# Altium footprint library h_sensor_safety.PcbLib: 73 footprints (part 1 of 5)
Each footprint in its own frame and in the unit in brackets; x right, y up, seen from the top. Pads: shape width x height; smd on the part's side, far side on the other; paste and mask are expansions set on the pad; w line width, h text height; cw(c..) or ccw(c..) is an arc to the next point about the centre after c.
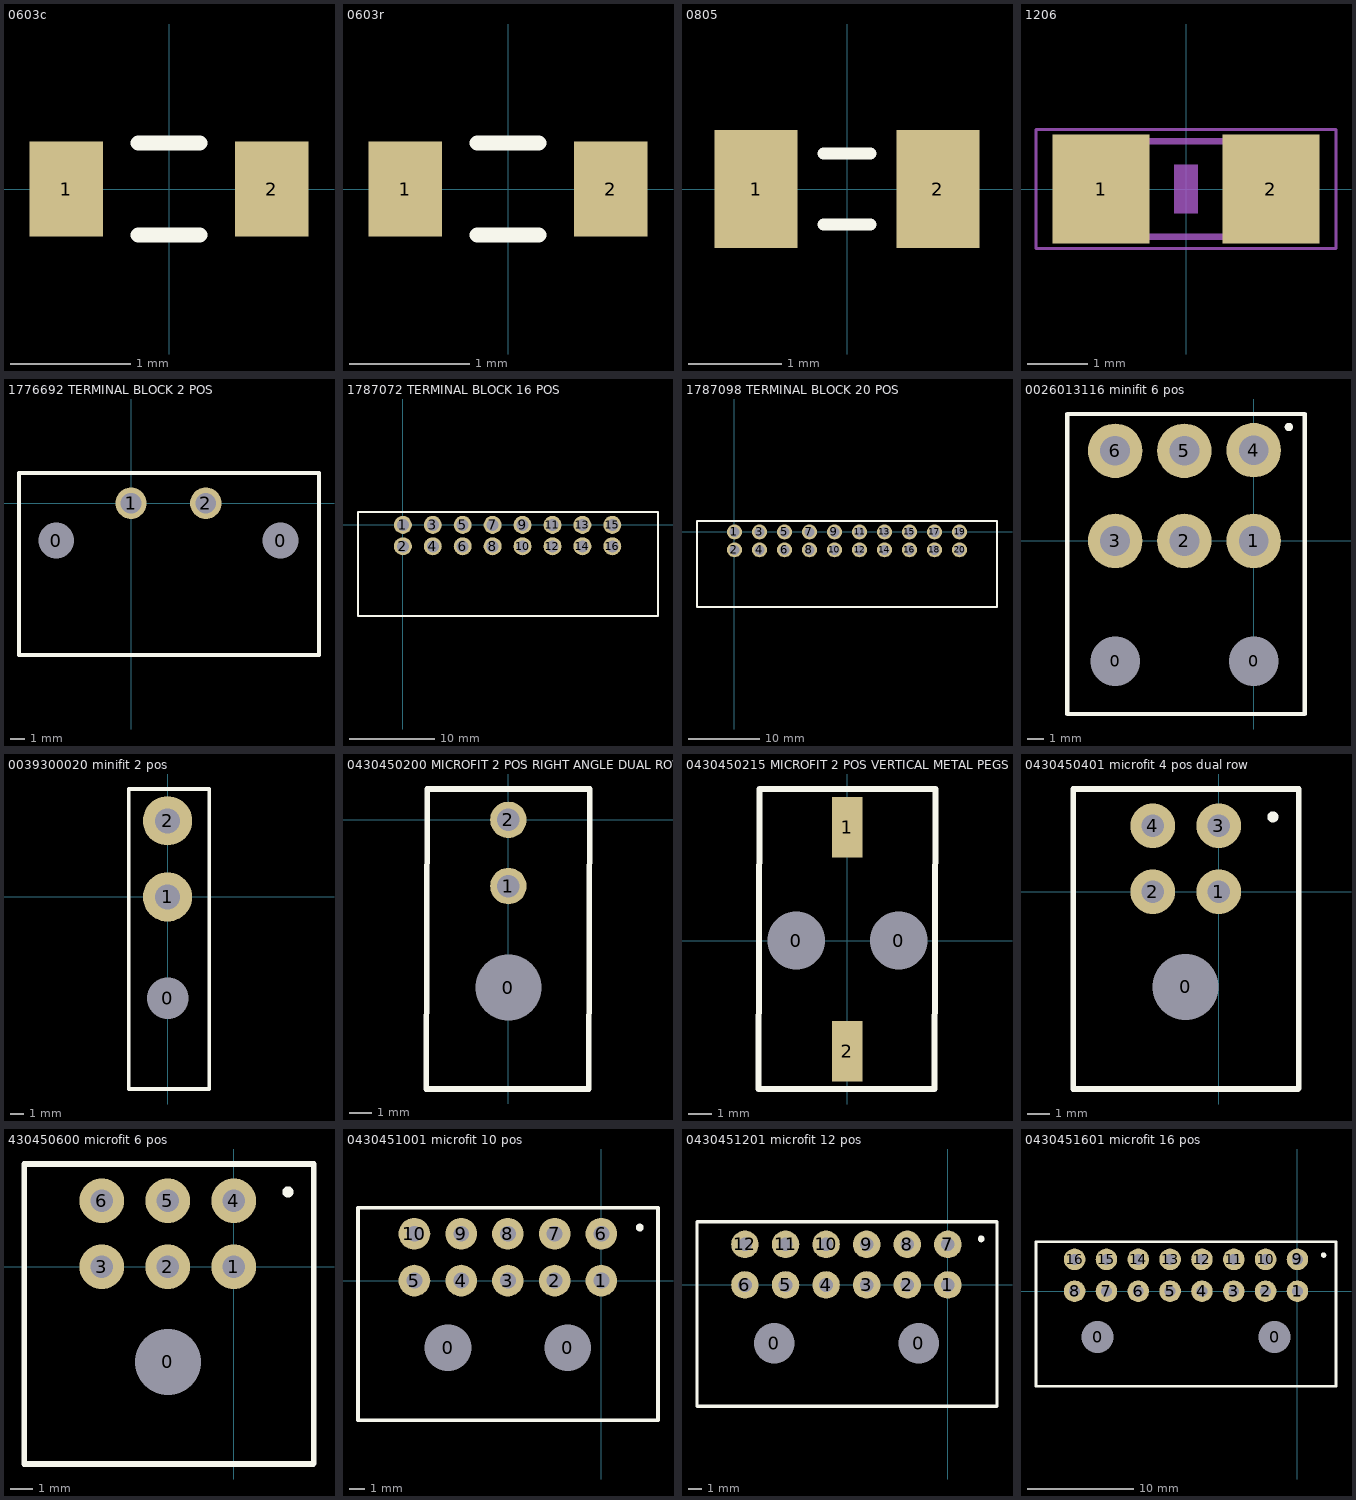
[diagram p0: the footprints below, top view; thin cyan lines are the x and y axes]

## 0603c [mil]
pads (2):
  rect 24x31 smd: 1(-33.5,0) 2(33.5,0)
Top Overlay:
  lines w5: -10,-15 10,-15 ; -10,15 10,15
3D body "User Library-C0603-2.step": height 31.5, standoff 0, extent -31.5,-15.5 31.5,16

## 0603r [mil]
pads (2):
  rect 24x31 smd: 1(-33.5,0) 2(33.5,0)
Top Overlay:
  lines w5: -10,-15 10,-15 ; -10,15 10,15
3D body "User Library-RES_1609-0603.step": height 22.05, standoff 0, extent -33.46,-15.74 33.47,15.75

## 0805 [mil]
pads (2):
  rect 35x50 smd: 1(-38.5,0) 2(38.5,0)
Top Overlay:
  lines w5: -10,-15 10,-15 ; -10,15 10,15
Mechanical 6:
  text ".Designator" at -65,-25 h19.68
3D body "CircuitWorks-RC0805.step": height 23.62, standoff 0, extent -38.37,-24.6 40.37,24.61

## 1206 [mm]
pads (2):
  rect 1.6x1.8 smd: 1(-1.4,0) 2(1.4,0)
Mechanical 6:
  rectangle: -0.2,-0.4 0.2,0.4
Top Component Center:
  rectangle: 0.952,-0.849 1.702,0.851
  rectangle: -1.702,-0.851 -0.952,0.849
  lines w0.051: -2.473,-0.983 -2.473,0.983 2.473,0.983 2.473,-0.983 -2.473,-0.983
  lines w0.102: -0.965,-0.787 0.965,-0.787 ; -0.965,0.787 0.965,0.787
3D body "User Library-1206 SMD Capacitor.step": height 1, standoff 0, extent -1.6,-0.8 1.6,0.8

## 1776692 TERMINAL BLOCK 2 POS [mm] "2 pos terminal block 5mm pitch"
pads (4):
  round 2.1 hole 2.4 unplated: 0(-5,-2.5) 0(10,-2.5)
  round 2.1 hole 1.4: 1(0,0) 2(5,0)
Top Overlay:
  lines w0.254: -7.493,-10.16 -7.493,2.032 12.573,2.032 12.573,-10.16 -7.493,-10.16
3D body "pxc_1776692_06_MSTB-2-5-2-GF_3D.stp": height 8.6, standoff -3.5, extent -7.46,-10.095 12.54,1.905

## 1787072 TERMINAL BLOCK 16 POS [mm] "16 position terminal block PCB connector"
pads (16):
  round 2.1 hole 1.4: 1(0,0) 2(0,-2.5) 3(3.5,0) 4(3.5,-2.5) 5(7,0) 6(7,-2.5) 7(10.5,0) 8(10.5,-2.5) 9(14,0) 10(14,-2.5) 11(17.5,0) 12(17.5,-2.5) 13(21,0) 14(21,-2.5) 15(24.5,0) 16(24.5,-2.5)
Top Overlay:
  lines w0.254: -5.25,-10.668 29.845,-10.668 29.845,1.524 -5.25,1.524 -5.25,-10.668
3D body "pxc_1787072_01_DMC-1-5-8-G1F-3-5-LR-P20THR_3D.stp": height 10.8, standoff -2, extent -5.252,-10.541 29.748,1.059

## 1787098 TERMINAL BLOCK 20 POS [mm] "20 position terminal block PCB connector"
pads (20):
  round 2.1 hole 1.4: 1(0,0) 2(0,-2.5) 3(3.5,0) 4(3.5,-2.5) 5(7,0) 6(7,-2.5) 7(10.5,0) 8(10.5,-2.5) 9(14,0) 10(14,-2.5) 11(17.5,0) 12(17.5,-2.5) 13(21,0) 14(21,-2.5) 15(24.5,0) 16(24.5,-2.5) 17(28,0) 18(28,-2.5) 19(31.5,0) 20(31.5,-2.5)
Top Overlay:
  lines w0.254: -5.25,-10.5 36.75,-10.5 36.75,1.524 -5.25,1.524 -5.25,-10.5
3D body "pxc_1787098_01_DMC-1-5-10-G1F-3-5-LR-P20THR_3D.stp": height 10.8, standoff -2, extent -5.252,-10.541 36.748,1.059

## 0026013116 minifit 6 pos [mil] "right angle 6 pos minifit connector"
pads (8):
  round 50 hole 118: 0(-330.71,-287) 0(0,-287)
  round 130 hole 71: 1(0,0) 2(-165.35,0) 3(-330.71,0) 4(0,216.54) 5(-165.35,215.07) 6(-330.71,215.07)
Top Overlay:
  circle w9.84: c84,272 r4.92
  lines w10: -445,-413 -445,303 122,303 122,-413 -445,-413
3D body "026013116.stp": height 448.82, standoff -141.73, extent -442.06,-542.42 117,242.42

## 0039300020 minifit 2 pos [mil]
pads (3):
  round 80 hole 118.11 unplated: 0(0,-287.4)
  round 140 hole 71: 1(0,0) 2(0,216.54)
Top Overlay:
  lines w10: -111,-546 118,-546 119,-545 119,307 -111,307 -111,-546
3D body "039300020 minifit 2 pos.stp": height 448.82, standoff -141.73, extent -110,-543.42 118.35,241.42

## 0430450200 MICROFIT 2 POS RIGHT ANGLE DUAL ROW [mil]
pads (3):
  round 100 hole 117.99 unplated: 0(0,-299)
  round 65 hole 40: 1(0,-118.11) 2(0,0)
Top Overlay:
  lines w10: -146.36,-480 143.65,-480 145.11,55 -144.9,55 -146.36,-480
3D body "430450200.stp": height 347.83, standoff -122.64, extent -140.75,-469.88 140.75,12.01

## 0430450215 MICROFIT 2 POS VERTICAL METAL PEGS [mil] "molex microfit 2 pin vertical"
pads (4):
  round 50 hole 95 unplated: 0(-84.49,0) 0(84.5,0)
  rect 50x100 smd: 1(0,186.99) 2(0,-183)
Top Overlay:
  lines w10: -146.24,-245 143.78,-245 145.13,250 -144.89,250 -146.24,-245
3D body "430450215.stp": height 391.73, standoff -77.17, extent -140.74,-220.86 140.76,220.09

## 0430450401 microfit 4 pos dual row [mil] "microfit 4 pos dual row plastic board lock pegs"
pads (5):
  round 80 hole 118.11 unplated: 0(-59.06,-170.08)
  round 80 hole 40: 1(0,0) 2(-118.11,0) 3(0,118.11) 4(-118.11,118.11)
Top Overlay:
  circle w9.84: c97,134 r4.92
  lines w10: -260,-353 142,-353 143,-352 143,184 -260,184 -260,-353
3D body "430450401 4 pos.stp": height 347.64, standoff -122.83, extent -259.35,-348.07 140.25,133.81

## 430450600 microfit 6 pos [mil] "microfit 6 pos plastic board lock pegs"
pads (7):
  round 80 hole 118.11 unplated: 0(-118.11,-170.08)
  round 80 hole 40: 1(0,0) 2(-118.11,0) 3(-236.22,0) 4(0,118.11) 5(-118.11,118.11) 6(-236.22,118.11)
Top Overlay:
  circle w9.84: c97,134 r4.92
  lines w10: -375,-353 -375,184 143,184 143,-352 142,-353 -375,-353
3D body "430450600.stp": height 347.64, standoff -122.83, extent -376.97,-348.07 140.75,133.81

## 0430451001 microfit 10 pos [mil] "microfit 10 pos plastic board lock pegs"
pads (12):
  round 80 hole 118.11 unplated: 0(-387.44,-170.08) 0(-85.04,-170.08)
  round 80 hole 40: 1(0,0) 2(-118.11,0) 3(-236.22,0) 4(-354.33,0) 5(-472.44,0) 6(0,118.11) 7(-118.11,118.11) 8(-236.22,118.11) 9(-354.33,118.11) 10(-472.44,118.11)
Top Overlay:
  circle w9.84: c97,134 r4.92
  lines w10: -615,-353 142,-353 143,-352 143,184 -615,184 -615,-353
3D body "430451002 10 pos.stp": height 347.64, standoff -122.83, extent -613.69,-348.07 140.25,133.81

## 0430451201 microfit 12 pos [mil] "microfit 12 pos plastic board lock pegs"
pads (14):
  round 80 hole 118.11 unplated: 0(-505.55,-170.08) 0(-85.04,-170.08)
  round 80 hole 40: 1(0,0) 2(-118.11,0) 3(-236.22,0) 4(-354.33,0) 5(-472.44,0) 6(-590.55,0) 7(0,118.11) 8(-118.11,118.11) 9(-236.22,118.11) 10(-354.33,118.11) 11(-472.44,118.11) 12(-590.55,118.11)
Top Overlay:
  circle w9.84: c97,134 r4.92
  lines w10: -730,-353 142,-353 143,-352 143,184 -730,184 -730,-353
3D body "430451201 12 pos.stp": height 347.64, standoff -122.83, extent -731.79,-348.07 140.25,133.81

## 0430451601 microfit 16 pos [mil] "microfit 16 pos plastic board lock pegs"
pads (18):
  round 80 hole 118.11 unplated: 0(-741.77,-170.08) 0(-85.04,-170.08)
  round 80 hole 40: 1(0,0) 2(-118.11,0) 3(-236.22,0) 4(-354.33,0) 5(-472.44,0) 6(-590.55,0) 7(-708.66,0) 8(-826.77,0) 9(0,118.11) 10(-118.11,118.11) 11(-236.22,118.11) 12(-354.33,118.11) 13(-472.44,118.11) 14(-590.55,118.11) 15(-708.66,118.11) 16(-826.77,118.11)
Top Overlay:
  circle w9.84: c97,134 r4.92
  lines w10: -970,-353 -970,184 143,184 143,-352 142,-353 -970,-353
3D body "430451601 16 pos.stp": height 347.64, standoff -122.83, extent -968.01,-348.07 140.25,133.81